# Altium footprint library 5-C-THD.PcbLib: 166 footprints (part 5 of 11)
Each footprint in its own frame and in the unit in brackets; x right, y up, seen from the top. Pads: shape width x height; smd on the part's side, far side on the other; paste and mask are expansions set on the pad; w line width, h text height; cw(c..) or ccw(c..) is an arc to the next point about the centre after c.
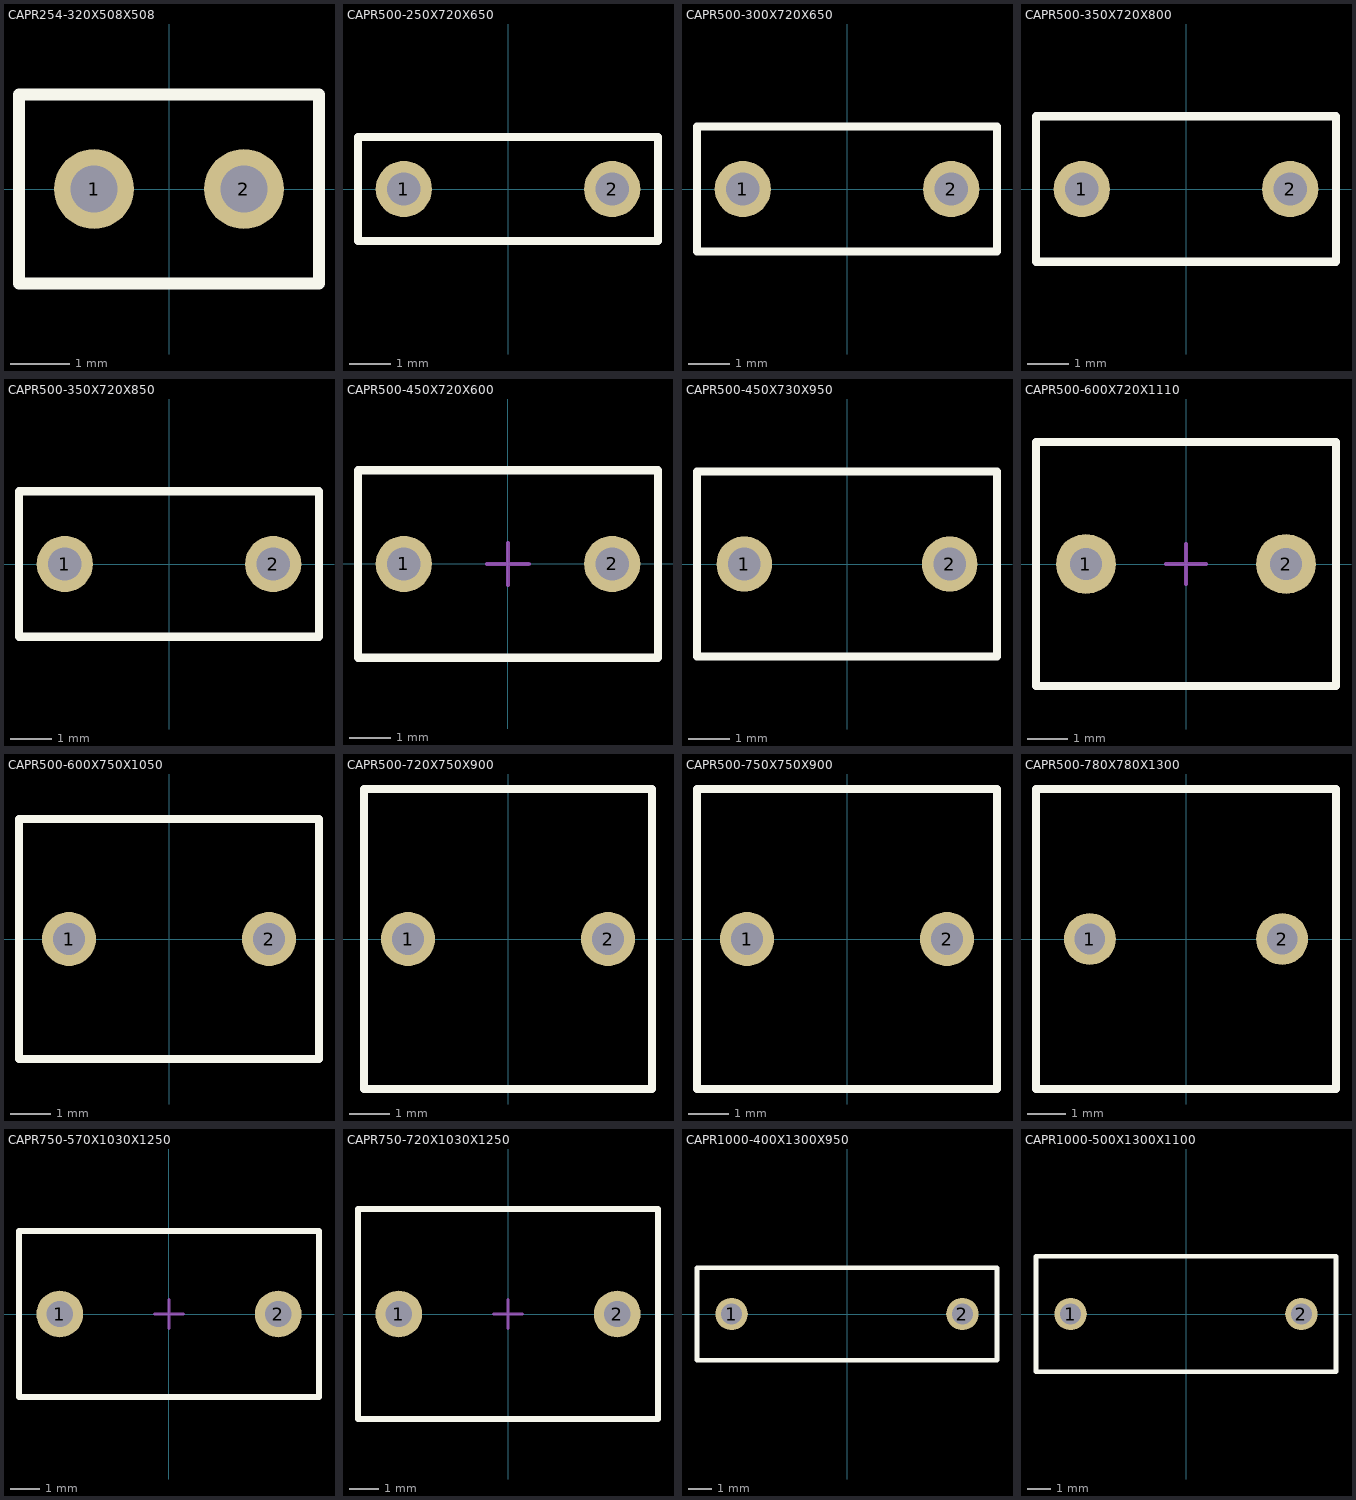
[diagram p4: the footprints below, top view; thin cyan lines are the x and y axes]

## CAPR254-320X508X508 [mm] "Capacitor Radial, Pin spacing 2.54mm - Body With 3.2mm X Body Length 5.08mm X Body Height 5.08mm"
height 5.08
pads (2):
  round 1.35 hole 0.8: 1(-1.27,0) 2(1.27,0)
Top Overlay:
  lines w0.2: -2.54,-1.6 2.54,-1.6 2.54,1.6 -2.54,1.6 -2.54,-1.6
Mechanical 13:
  lines w0.1: -2.54,-1.6 2.54,-1.6 2.54,1.6 -2.54,1.6 -2.54,-1.6
Mechanical 14:
  lines w0.1: -2.54,-1.6 -2.54,1.6 2.54,1.6 2.54,-1.6 -2.54,-1.6
3D body: height 5.08, standoff 0, extent -2.64,-1.7 2.64,1.7

## CAPR500-250X720X650 [mm] "Capacitor Radial, Pin spacing 5.0mm - Body With 2.5mm X Body Length 7.2mm X Body Height 6.5mm"
height 6.5
pads (2):
  round 1.35 hole 0.8: 1(-2.5,0) 2(2.5,0)
Top Overlay:
  lines w0.2: -3.6,-1.25 -3.6,1.25 3.6,1.25 3.6,-1.25 -3.6,-1.25
Mechanical 13:
  lines w0.1: -3.6,-1.25 3.6,-1.25 3.6,1.25 -3.6,1.25 -3.6,-1.25
Mechanical 14:
  lines w0.1: -3.6,-1.25 -3.6,1.25 3.6,1.25 3.6,-1.25 -3.6,-1.25
3D body "CAPR500-250X720X650.stp": height 6.5, standoff -3.8, extent -3.599,-1.249 3.601,1.251

## CAPR500-300X720X650 [mm] "Capacitor Radial, Pin spacing 5.0mm - Body With 3.0mm X Body Length 7.2mm X Body Height 6.5mm"
height 6.5
pads (2):
  round 1.35 hole 0.8: 1(-2.5,0) 2(2.5,0)
Top Overlay:
  lines w0.2: -3.6,-1.5 3.6,-1.5 3.6,1.5 -3.6,1.5 -3.6,-1.5
Mechanical 13:
  lines w0.1: -3.6,-1.5 -3.6,1.5 3.6,1.5 3.6,-1.5 -3.6,-1.5
Mechanical 14:
  lines w0.1: -3.6,-1.5 3.6,-1.5 3.6,1.5 -3.6,1.5 -3.6,-1.5
3D body "CAPR500-300X720X650.stp": height 6.5, standoff -3.8, extent -3.599,-1.499 3.601,1.501

## CAPR500-350X720X800 [mm] "Capacitor Radial, Pin spacing 5.0mm - Body With 3.5mm X Body Length 7.2mm X Body Height 8mm"
height 8
pads (2):
  round 1.35 hole 0.8: 1(-2.5,0) 2(2.5,0)
Top Overlay:
  lines w0.2: -3.6,-1.75 3.6,-1.75 3.6,1.75 -3.6,1.75 -3.6,-1.75
Mechanical 13:
  lines w0.1: -3.6,-1.75 -3.6,1.75 3.6,1.75 3.6,-1.75 -3.6,-1.75
Mechanical 14:
  lines w0.1: -3.6,-1.75 3.6,-1.75 3.6,1.75 -3.6,1.75 -3.6,-1.75
3D body "CAPR500-350X720X800.stp": height 8, standoff -3.8, extent -3.599,-1.749 3.601,1.751

## CAPR500-350X720X850 [mm] "Capacitor Radial, Pin spacing 5.0mm - Body With 3.5mm X Body Length 7.2mm X Body Height 8.5mm"
height 8.5
pads (2):
  round 1.35 hole 0.8: 1(-2.5,0) 2(2.5,0)
Top Overlay:
  lines w0.2: -3.6,-1.75 3.6,-1.75 3.6,1.75 -3.6,1.75 -3.6,-1.75
Mechanical 13:
  lines w0.1: -3.6,-1.75 -3.6,1.75 3.6,1.75 3.6,-1.75 -3.6,-1.75
Mechanical 14:
  lines w0.1: -3.6,-1.75 3.6,-1.75 3.6,1.75 -3.6,1.75 -3.6,-1.75
3D body "CAPR500-350X720X850.stp": height 8.5, standoff -3.8, extent -3.599,-1.749 3.601,1.751

## CAPR500-450X720X600 [mm] "Capacitor Radial, Pin spacing 5.0mm - Body With 4.5mm X Body Length 7.2mm X Body Height 6mm"
height 6
pads (2):
  round 1.35 hole 0.8: 1(-2.5,0) 2(2.5,0)
Top Overlay:
  lines w0.2: -3.6,-2.25 3.6,-2.25 3.6,2.25 -3.6,2.25 -3.6,-2.25
Mechanical 8:
  lines w0.1: -3,0 -2.5,0 ; -2.5,-0.5 -2.5,0 ; -2.5,0.5 -2.5,0 ; -2,0 -2.5,0 ; -0.5,0 0,0 ; 0,-0.5 0,0 ; 0,0.5 0,0 ; 0.5,0 0,0 ; 2,0 2.5,0 ; 2.5,-0.5 2.5,0 ; 2.5,0.5 2.5,0 ; 3,0 2.5,0
Mechanical 14:
  lines w0.1: -3.6,-2.25 3.6,-2.25 3.6,2.25 -3.6,2.25 -3.6,-2.25
3D body "CAPR500-450X720X600.stp": height 6, standoff -3.2, extent -3.6,-2.25 3.6,2.25

## CAPR500-450X730X950 [mm] "Capacitor Radial, Pin spacing 5.0mm - Body With 4.5mm X Body Length 7.3mm X Body Height 9.5mm"
height 9.5
pads (2):
  round 1.35 hole 0.8: 1(-2.5,0) 2(2.5,0)
Top Overlay:
  lines w0.2: -3.65,-2.25 -3.65,2.25 3.65,2.25 3.65,-2.25 ; -3.6,-2.25 3.6,-2.25
Mechanical 13:
  lines w0.1: -3.65,-2.25 -3.65,2.25 3.65,2.25 3.65,-2.25 -3.65,-2.25
Mechanical 14:
  lines w0.1: -3.65,-2.25 3.65,-2.25 3.65,2.25 -3.65,2.25 -3.65,-2.25
3D body "CAPR500-450X730X950.stp": height 9.5, standoff -3.8, extent -3.649,-2.249 3.651,2.251

## CAPR500-600X720X1110 [mm] "Capacitor Radial, Pin spacing 5.0mm - Body With 6mm X Body Length 7.2mm X Body Height 11.1mm"
height 11.1
pads (2):
  round 1.5 hole 0.8: 1(-2.5,0) 2(2.5,0)
Top Overlay:
  lines w0.2: -3.75,-3.05 -3.75,3.05 3.75,3.05 3.75,-3.05 -3.75,-3.05
Mechanical 4:
  lines w0.1: -3,0 -2.5,0 ; -2.5,-0.5 -2.5,0 ; -2.5,0.5 -2.5,0 ; -2,0 -2.5,0 ; -0.5,0 0,0 ; 0,-0.5 0,0 ; 0,0.5 0,0 ; 0.5,0 0,0 ; 2,0 2.5,0 ; 2.5,-0.5 2.5,0 ; 2.5,0.5 2.5,0 ; 3,0 2.5,0
Mechanical 14:
  lines w0.1: -3.75,-3.05 3.75,-3.05 3.75,3.05 -3.75,3.05 -3.75,-3.05
3D body "CAPR500-600X720X1110.stp": height 11.1, standoff -3.8, extent -3.75,-3.05 3.75,3.05

## CAPR500-600X750X1050 [mm] "Capacitor Radial, Pin spacing 5.0mm - Body Width 6mm X Body Length 7.5mm X Body Height 10.5mm"
height 10.5
pads (2):
  round 1.35 hole 0.8: 1(-2.5,0) 2(2.5,0)
Top Overlay:
  lines w0.2: -3.75,-3 3.75,-3 3.75,3 -3.75,3 -3.75,-3
Mechanical 13:
  lines w0.1: -3.75,-3 -3.75,3 3.75,3 3.75,-3 -3.75,-3
Mechanical 14:
  lines w0.1: -3.75,-3 3.75,-3 3.75,3 -3.75,3 -3.75,-3
3D body "CAPR500-600X750X1050.stp": height 10.5, standoff -3.8, extent -3.749,-2.999 3.751,3.001

## CAPR500-720X750X900 [mm] "Capacitor Radial, Pin spacing 5.0mm - Body With 7.2mm X Body Length 7.5mm X Body Height 9mm"
height 9
pads (2):
  round 1.35 hole 0.8: 1(-2.5,0) 2(2.5,0)
Top Overlay:
  lines w0.2: -3.6,-3.75 3.6,-3.75 3.6,3.75 -3.6,3.75 -3.6,-3.75
Mechanical 14:
  lines w0.1: -3.6,-3.75 -3.6,3.75 3.6,3.75 3.6,-3.75 -3.6,-3.75
3D body "CAPR500-720X750X900.stp": height 9, standoff -3.2, extent -3.6,-3.75 3.6,3.75

## CAPR500-750X750X900 [mm] "Capacitor Radial, Pin spacing 5.0mm - Body With 7.5mm X Body Length 7.5mm X Body Height 9mm"
height 9
pads (2):
  round 1.35 hole 0.8: 1(-2.5,0) 2(2.5,0)
Top Overlay:
  lines w0.2: -3.75,-3.75 -3.75,3.75 3.75,3.75 3.75,-3.75 -3.75,-3.75
Mechanical 14:
  lines w0.1: -3.75,-3.75 -3.75,3.75 3.75,3.75 3.75,-3.75 -3.75,-3.75
3D body "CAPR500-750X750X900.stp": height 9, standoff -3.8, extent -3.749,-3.749 3.751,3.751

## CAPR500-780X780X1300 [mm] "Capacitor Radial, Pin spacing 5.0mm - Body With 7.8mm X Body Length 7.8mm X Body Height 13mm"
height 13
pads (2):
  round 1.35 hole 0.8: 1(-2.5,0) 2(2.5,0)
Top Overlay:
  lines w0.2: -3.9,-3.9 3.9,-3.9 3.9,3.9 -3.9,3.9 -3.9,-3.9
Mechanical 13:
  lines w0.1: -3.9,-3.9 -3.9,3.9 3.9,3.9 3.9,-3.9 -3.9,-3.9
Mechanical 14:
  lines w0.1: -3.9,-3.9 3.9,-3.9 3.9,3.9 -3.9,3.9 -3.9,-3.9
3D body "CAPR500-780X780X1300.stp": height 13, standoff -3.8, extent -3.899,-3.899 3.901,3.901

## CAPR750-570X1030X1250 [mm] "Capacitor Radial, Pin spacing 7.5mm - Body With 5.7mm X Body Length 10.3mm X Body Height 12.5mm"
height 12.5
pads (2):
  round 1.6 hole 0.9: 1(-3.75,0) 2(3.75,0)
Top Overlay:
  lines w0.2: -5.15,-2.85 5.15,-2.85 5.15,2.85 -5.15,2.85 -5.15,-2.85
Mechanical 8:
  lines w0.1: -4.25,0 -3.75,0 ; -3.75,-0.5 -3.75,0 ; -3.75,0.5 -3.75,0 ; -3.25,0 -3.75,0 ; -0.5,0 0,0 ; 0,-0.5 0,0 ; 0,0.5 0,0 ; 0.5,0 0,0 ; 3.25,0 3.75,0 ; 3.75,-0.5 3.75,0 ; 3.75,0.5 3.75,0 ; 4.25,0 3.75,0
Mechanical 14:
  lines w0.1: -5.15,-2.85 5.15,-2.85 5.15,2.85 -5.15,2.85 -5.15,-2.85
3D body "CAPR750-570X1030X1250.stp": height 12.5, standoff -3.8, extent -5.15,-2.85 5.15,2.85

## CAPR750-720X1030X1250 [mm] "Capacitor Radial, Pin spacing 7.5mm - Body With 7.2mm X Body Length 10.3mm X Body Height 12.5mm"
height 12.5
pads (2):
  round 1.6 hole 0.9: 1(-3.75,0) 2(3.75,0)
Top Overlay:
  lines w0.2: -5.15,-3.6 -5.15,3.6 5.15,3.6 5.15,-3.6 -5.15,-3.6
Mechanical 8:
  lines w0.1: -4.25,0 -3.75,0 ; -3.75,-0.5 -3.75,0 ; -3.75,0.5 -3.75,0 ; -3.25,0 -3.75,0 ; -0.5,0 0,0 ; 0,-0.5 0,0 ; 0,0.5 0,0 ; 0.5,0 0,0 ; 3.25,0 3.75,0 ; 3.75,-0.5 3.75,0 ; 3.75,0.5 3.75,0 ; 4.25,0 3.75,0
Mechanical 14:
  lines w0.1: -5.15,-3.6 -5.15,3.6 5.15,3.6 5.15,-3.6 -5.15,-3.6
3D body "CAPR750-720X1030X1250.stp": height 12.5, standoff -3.8, extent -5.15,-3.6 5.15,3.6

## CAPR1000-400X1300X950 [mm] "Capacitor Radial, Pin spacing 10mm - Body With 4mm X Body Length 13mm X Body Height 9.5mm"
height 9.5
pads (2):
  round 1.4 hole 0.9: 1(-5,0) 2(5,0)
Top Overlay:
  lines w0.2: -6.5,-2 6.5,-2 6.5,2 -6.5,2 -6.5,-2
Mechanical 13:
  lines w0.1: -6.5,-2 -6.5,2 6.5,2 6.5,-2 -6.5,-2
Mechanical 14:
  lines w0.1: -6.5,-2 6.5,-2 6.5,2 -6.5,2 -6.5,-2
3D body "CAPR1000-400X1300X950.stp": height 9.5, standoff -3.8, extent -6.5,-2 6.5,2

## CAPR1000-500X1300X1100 [mm] "Capacitor Radial, Pin spacing 10mm - Body With 5mm X Body Length 13mm X Body Height 11mm"
height 11
pads (2):
  round 1.4 hole 0.9: 1(-5,0) 2(5,0)
Top Overlay:
  lines w0.2: -6.5,-2.5 6.5,-2.5 6.5,2.5 -6.5,2.5 -6.5,-2.5
Mechanical 13:
  lines w0.1: -6.5,-2.5 -6.5,2.5 6.5,2.5 6.5,-2.5 -6.5,-2.5
Mechanical 14:
  lines w0.1: -6.5,-2.5 6.5,-2.5 6.5,2.5 -6.5,2.5 -6.5,-2.5
3D body "CAPR1000-500X1300X1100.stp": height 11, standoff -3.8, extent -6.5,-2.499 6.5,2.501